# Altium footprint library motionboard.PcbLib: 89 footprints (part 6 of 6)
Each footprint in its own frame and in the unit in brackets; x right, y up, seen from the top. Pads: shape width x height; smd on the part's side, far side on the other; paste and mask are expansions set on the pad; w line width, h text height; cw(c..) or ccw(c..) is an arc to the next point about the centre after c.
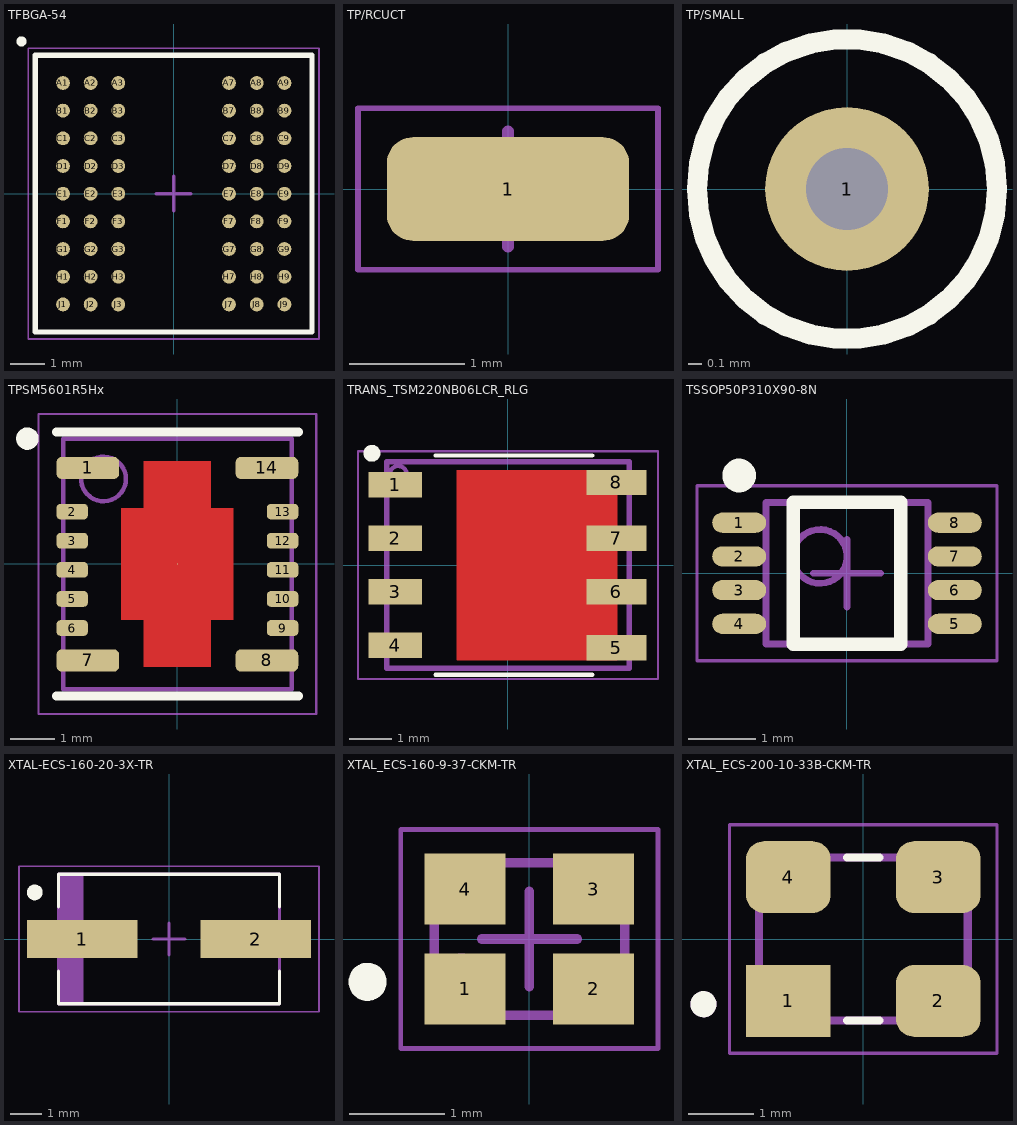
[diagram p5: the footprints below, top view; thin cyan lines are the x and y axes]

## TFBGA-54 [mm]
height 1.2
pads (54):
  round 0.4 smd: A1(-3.2,3.2) A2(-2.4,3.2) A3(-1.6,3.2) A7(1.6,3.2) A8(2.4,3.2) A9(3.2,3.2) B1(-3.2,2.4) B2(-2.4,2.4) B3(-1.6,2.4) B7(1.6,2.4) B8(2.4,2.4) B9(3.2,2.4) C1(-3.2,1.6) C2(-2.4,1.6) C3(-1.6,1.6) C7(1.6,1.6) C8(2.4,1.6) C9(3.2,1.6) D1(-3.2,0.8) D2(-2.4,0.8) D3(-1.6,0.8) D7(1.6,0.8) D8(2.4,0.8) D9(3.2,0.8) E1(-3.2,0) E2(-2.4,0) E3(-1.6,0) E7(1.6,0) E8(2.4,0) E9(3.2,0) F1(-3.2,-0.8) F2(-2.4,-0.8) F3(-1.6,-0.8) F7(1.6,-0.8) F8(2.4,-0.8) F9(3.2,-0.8) G1(-3.2,-1.6) G2(-2.4,-1.6) G3(-1.6,-1.6) G7(1.6,-1.6) G8(2.4,-1.6) G9(3.2,-1.6) H1(-3.2,-2.4) H2(-2.4,-2.4) H3(-1.6,-2.4) H7(1.6,-2.4) H8(2.4,-2.4) H9(3.2,-2.4) J1(-3.2,-3.2) J2(-2.4,-3.2) J3(-1.6,-3.2) J7(1.6,-3.2) J8(2.4,-3.2) J9(3.2,-3.2)
Top Overlay:
  circle w0.15: c-4.4,4.4 r0.071
  lines w0.15: -4,-4 4,-4 4,4 -4,4 -4,-4
Top Assembly:
  lines w0.1: -4,-4 -4,4 4,4 4,-4 -4,-4
Top Courtyard:
  lines w0.05: -4.2,-4.2 4.2,-4.2 4.2,4.2 -4.2,4.2 -4.2,-4.2
  lines w0.1: -0.5,0 0.5,0 ; 0,-0.5 0,0.5
Top Designator:
  text ".Designator" at -2.865,-0.111 h1.2
3D body "TF-BGA54L.STEP": height 0.65, standoff -0.05, extent -4,-4 4,4

## TP/RCUCT [mm]
pads (1):
  rrect50% 2.1x0.9 smd: 1(0,0)
Top Assembly:
  lines w0.1: -0.8,-0.4 -0.8,0.4 0.8,0.4 0.8,-0.4 -0.8,-0.4
Top Courtyard:
  lines w0.05: -1.3,-0.7 1.3,-0.7 1.3,0.7 -1.3,0.7 -1.3,-0.7
  lines w0.1: -0.5,0 0.5,0 ; 0,-0.5 0,0.5
Top Designator:
  text ".Designator" at -2.705,-0.272 h1.2
3D body "RCU.STEP": height 1.15, standoff 0, extent -0.8,-0.4 0.8,0.4

## TP/SMALL [mm]
pads (1):
  round 1.2 hole 0.6: 1(0,0)
Top Overlay:
  circle w0.15: c0,0 r1.1
Top Designator:
  text ".Designator" at -2.705,-0.272 h1.2

## TPSM5601R5Hx [mm] "TPSM5601R5Hx series QFN, 14-Leads, Body 5.00x5.50mm, Pitch 0.65mm, Thermal Pad 2.50x4.60mm, Manufacturer Guidelines"
height 4.1
pads (15):
  rrect50% 1.4x0.5 smd: 1(-2,2.145) 7(-2,-2.155) 8(2,-2.155) 14(2,2.145)
  rrect50% 0.7x0.35 smd: 2(-2.35,1.17) 3(-2.35,0.52) 4(-2.35,-0.13) 5(-2.35,-0.78) 6(-2.35,-1.43) 9(2.35,-1.43) 10(2.35,-0.78) 11(2.35,-0.13) 12(2.35,0.52) 13(2.35,1.17)
  round 0.025 smd: 15(0,0)
Top Layer:
  region: -0.75,2.3 0.75,2.3 0.75,1.25 1.25,1.25 1.25,-1.25 0.75,-1.25 0.75,-2.3 -0.75,-2.3 -0.75,-1.25 -1.25,-1.25 -1.25,1.25 -0.75,1.25
Top Overlay:
  circle w0.25: c-3.35,2.8 r0.125
  lines w0.2: -2.7,-2.95 2.7,-2.95 ; -2.7,2.95 2.7,2.95
Top Assembly:
  circle w0.1: c-1.65,1.9 r0.5
  lines w0.1: -2.55,-2.8 -2.55,2.8 2.55,2.8 2.55,-2.8 -2.55,-2.8
Top Courtyard:
  lines w0.05: -3.1,-3.35 -3.1,3.35 3.1,3.35 3.1,-3.35 -3.1,-3.35
  lines w0.1: -0.5,0 0.5,0 ; 0,-0.5 0,0.5
Top Designator:
  text ".Designator" at -2.942,-0.272 h1.2
3D body "TPSM5601R5Hx.stp": height 4.1, standoff 0, extent -2.5,-2.75 2.5,2.75

## TRANS_TSM220NB06LCR_RLG [mm]
pads (8):
  rect 1.27x0.6 smd: 1(-2.67,1.905) 2(-2.67,0.635) 3(-2.67,-0.635) 4(-2.67,-1.905)
  rect 1.42x0.6 smd: 5(2.575,-1.96) 6(2.575,-0.635) 7(2.575,0.635) 8(2.575,1.96)
Top Layer:
  rectangle: -1.215,-2.26 2.595,2.26
Top Overlay:
  circle w0.2: c-3.225,2.65 r0.1
  lines w0.1: -1.715,-2.6 2,-2.6 ; -1.715,2.6 2,2.6
Top Paste:
  region: 0.235,-2.073 -0.965,-2.073 -0.965,-0.823 0.235,-0.823
  region: 1.718,-2.083 0.518,-2.083 0.518,-0.833 1.718,-0.833
  region: 1.743,0.787 0.543,0.787 0.543,2.037 1.743,2.037
  region: 0.203,0.772 -0.997,0.772 -0.997,2.022 0.203,2.022
Top Assembly:
  circle w0.1: c-2.6,2.15 r0.2
  lines w0.127: -2.875,-2.45 2.875,-2.45 2.875,2.45 -2.875,2.45 -2.875,-2.45
Top Courtyard:
  lines w0.05: -3.555,-2.7 3.56,-2.7 3.56,2.7 -3.555,2.7 -3.555,-2.7
  lines w0.1: -0.5,0 0.5,0 ; 0,-0.5 0,0.5
Top Designator:
  text ".Designator" at -2.702,-0.209 h1.2
3D body "step_temp.STEP": height 1.1, standoff 0, extent -3,-2.45 3,2.45

## TSSOP50P310X90-8N [mm] "TSSOP, 8-Leads, Body 2.00x2.30mm, Pitch 0.50mm, IPC Medium Density"
height 0.9
pads (8):
  oval 0.8x0.3 smd: 1(-1.6,0.75) 2(-1.6,0.25) 3(-1.6,-0.25) 4(-1.6,-0.75) 5(1.6,-0.75) 6(1.6,-0.25) 7(1.6,0.25) 8(1.6,0.75)
Top Overlay:
  circle w0.25: c-1.6,1.45 r0.125
  lines w0.2: -0.8,-1.05 0.8,-1.05 0.8,1.05 -0.8,1.05 -0.8,-1.05
Top Assembly:
  circle w0.1: c-0.4,0.25 r0.4
  lines w0.1: -1.2,-1.05 1.2,-1.05 1.2,1.05 -1.2,1.05 -1.2,-1.05
Top Courtyard:
  lines w0.05: -2.225,-1.3 2.225,-1.3 2.225,1.3 -2.225,1.3 -2.225,-1.3
  lines w0.1: -0.5,0 0.5,0 ; 0,-0.5 0,0.5
Top Designator:
  text ".Designator" at -2.705,-0.084 h1.2
3D body "TSSOP50P310X90-8N.step": height 0.9, standoff 0, extent -1.549,-1.05 1.549,1.05

## XTAL-ECS-160-20-3X-TR [mm] "CRYSTAL"
pads (2):
  rect 3.5x1.2 smd: 1(-2.75,0) 2(2.75,0)
Top Overlay:
  circle w0.3: c-4.25,1.475 r0.1
  lines w0.1: -3.5,-1.01 -3.5,-2.05 3.5,-2.05 3.5,-1.01 ; -3.5,1.01 -3.5,2.05 3.5,2.05 3.5,1.01
Top Assembly:
  rectangle: -3.5,-2.05 -2.7,2.05
  lines w0.1: -3.5,-2.05 3.5,-2.05 3.5,2.05 -3.5,2.05 -3.5,-2.05
Top Courtyard:
  lines w0.05: -4.75,-2.3 4.75,-2.3 4.75,2.3 -4.75,2.3 -4.75,-2.3
  lines w0.1: -0.5,0 0.5,0 ; 0,-0.5 0,0.5
Top Designator:
  text ".Designator" at -2.705,-0.272 h1.2
3D body "ECS-160-20-3X-TR.STEP": height 2.3, standoff 0, extent -3.8,-2.05 3.8,2.05

## XTAL_ECS-160-9-37-CKM-TR [mm]
pads (4):
  rect 0.85x0.75 smd: 1(-0.675,-0.525) 2(0.675,-0.525) 3(0.675,0.525) 4(-0.675,0.525)
Top Overlay:
  circle w0.2: c-1.7,-0.45 r0.1
Top Assembly:
  circle w0.1: c-0.7,-0.5 r0.3
  lines w0.1: -1,-0.8 1,-0.8 1,0.8 -1,0.8 -1,-0.8
Top Courtyard:
  lines w0.05: -1.35,-1.15 1.35,-1.15 1.35,1.15 -1.35,1.15 -1.35,-1.15
  lines w0.1: -0.5,0 0.5,0 ; 0,-0.5 0,0.5
Top Designator:
  text ".Designator" at -2.967,-0.272 h1.2
3D body "ECS-250-10-37B-CTN-TR.STEP": height 0.5, standoff 0, extent -1,-0.813 1,0.787

## XTAL_ECS-200-10-33B-CKM-TR [mm]
pads (4):
  rect 1.3x1.1 smd: 1(-1.15,-0.95)
  rrect50% 1.3x1.1 smd: 2(1.15,-0.95) 3(1.15,0.95) 4(-1.15,0.95)
Top Overlay:
  circle w0.2: c-2.45,-1 r0.1
  lines w0.127: -0.25,-1.25 0.25,-1.25 ; -0.25,1.25 0.25,1.25
Top 3D Body:
  circle w0.2: c-2.45,-1 r0.1
  lines w0.127: -1.6,-1.25 1.6,-1.25 1.6,1.25 -1.6,1.25 -1.6,-1.25
Top Courtyard:
  lines w0.05: -2.05,-1.75 2.05,-1.75 2.05,1.75 -2.05,1.75 -2.05,-1.75
Top Designator:
  text ".Designator" at -2.992,-0.272 h1.2